# Altium footprint library Libraries_2014_0618.PcbLib: 391 footprints (part 19 of 25)
Each footprint in its own frame and in the unit in brackets; x right, y up, seen from the top. Pads: shape width x height; smd on the part's side, far side on the other; paste and mask are expansions set on the pad; w line width, h text height; cw(c..) or ccw(c..) is an arc to the next point about the centre after c.
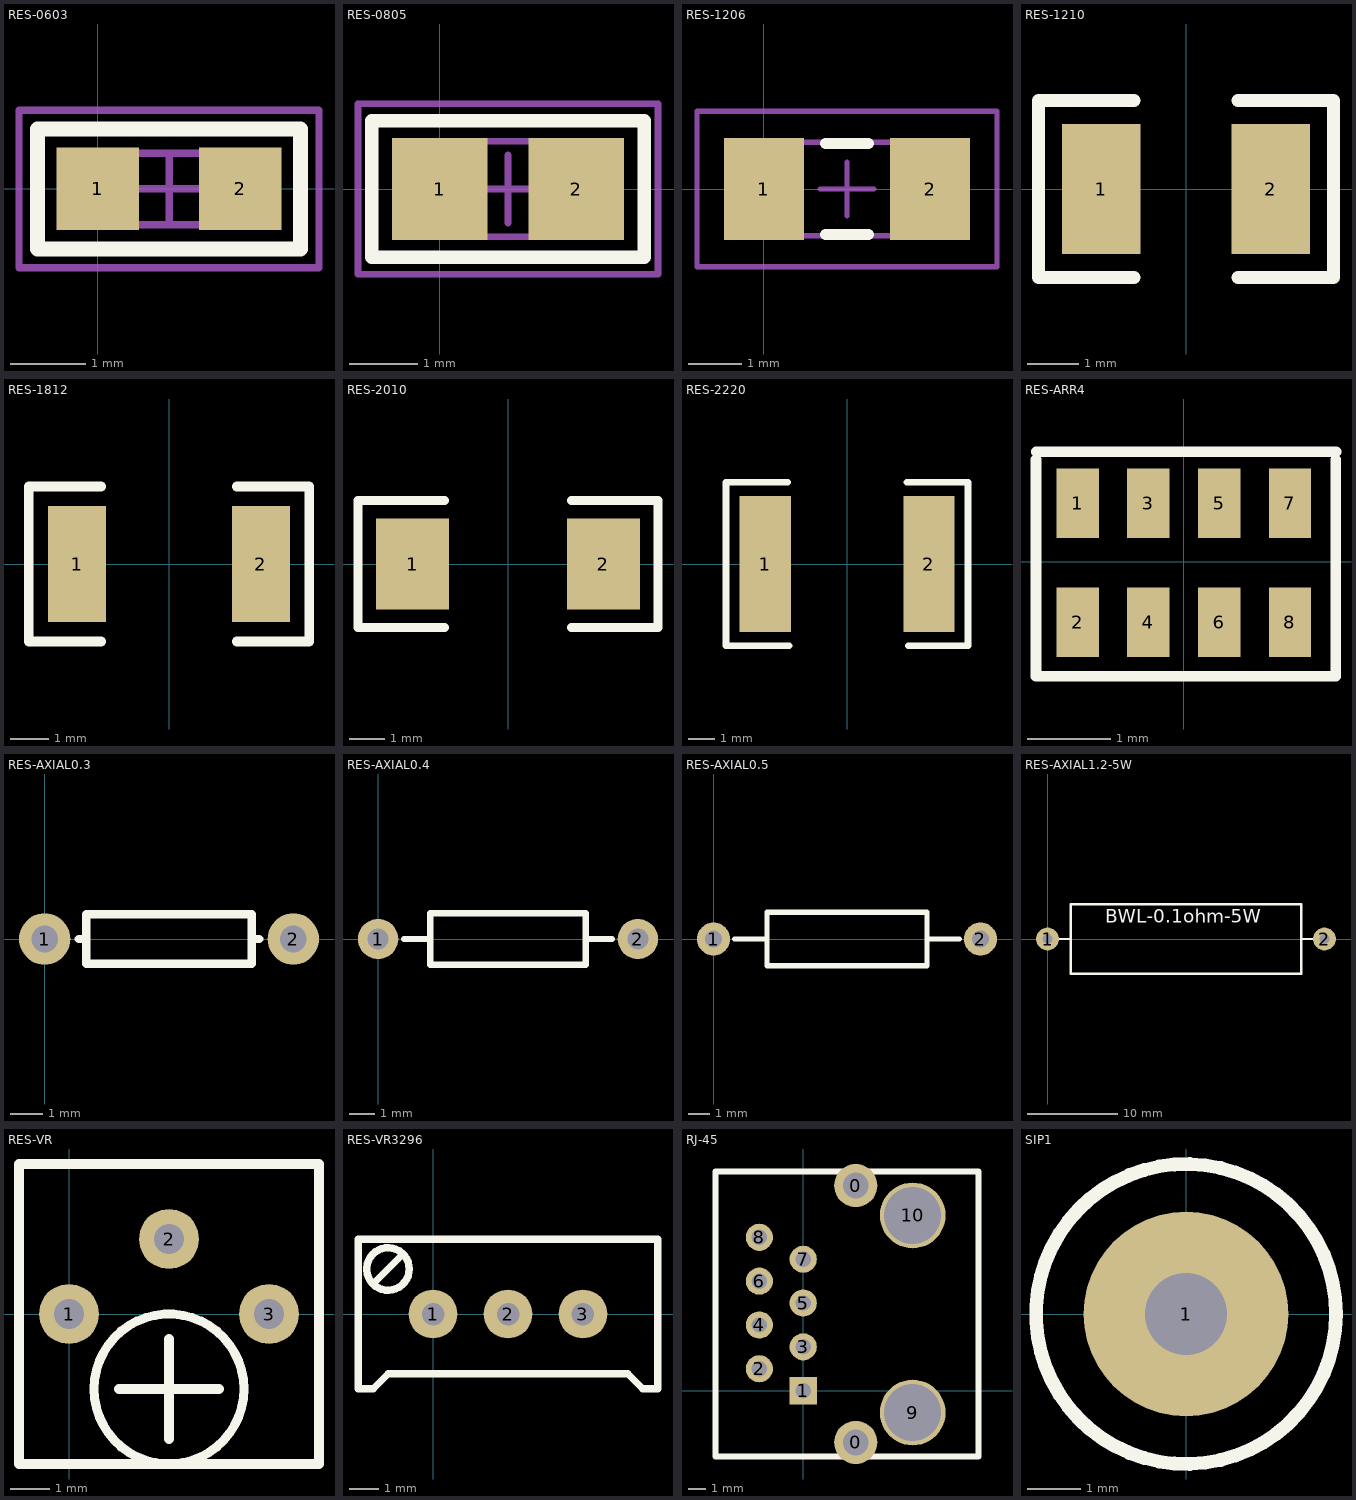
[diagram p18: the footprints below, top view; thin cyan lines are the x and y axes]

## RES-0603 [mm]
pads (2):
  rect 1.1x1.1 smd: 1(0,0) 2(1.9,0)
Top Overlay:
  lines w0.2: -0.8,-0.8 -0.8,0.8 2.7,0.8 2.7,-0.8 -0.8,-0.8
Mechanical 13:
  lines w0.1: 0.1,-0.475 0.1,0.475 1.8,0.475 1.8,-0.475 0.1,-0.475
Mechanical 15:
  lines w0.1: 0.475,0 1.425,0 ; 0.95,-0.475 0.95,0.475 ; -1.05,-1.05 -1.05,1.05 2.95,1.05 2.95,-1.05 -1.05,-1.05
3D body: height 0.6, standoff 0, extent 0.1,-0.475 1.8,0.475

## RES-0805 [mm]
pads (2):
  rect 1.4x1.5 smd: 1(0,0) 2(2,0)
Top Overlay:
  lines w0.2: -1,-1 3,-1 3,1 -1,1 -1,-1
Mechanical 13:
  lines w0.1: -0.075,-0.7 2.075,-0.7 2.075,0.7 -0.075,0.7 -0.075,-0.7
Mechanical 15:
  lines w0.1: 0.5,0 1.5,0 ; 1,-0.5 1,0.5 ; -1.2,-1.25 3.2,-1.25 3.2,1.25 -1.2,1.25 -1.2,-1.25
3D body: height 0.65, standoff 0, extent -0.075,-0.7 2.075,0.7

## RES-1206 [mm]
pads (2):
  rect 1.5x1.9 smd: 1(0,0) 2(3.1,0)
Top Overlay:
  lines w0.2: 1.15,-0.85 1.95,-0.85 ; 1.15,0.85 1.95,0.85
Mechanical 13:
  lines w0.1: -0.125,-0.875 -0.125,0.875 3.225,0.875 3.225,-0.875 -0.125,-0.875
Mechanical 15:
  lines w0.1: 1.05,0 2.05,0 ; 1.55,-0.5 1.55,0.5 ; -1.25,-1.45 -1.25,1.45 4.35,1.45 4.35,-1.45 -1.25,-1.45
3D body: height 0.71, standoff 0, extent -0.125,-0.875 3.225,0.875

## RES-1210 [mil]
pads (2):
  rect 60x100 smd: 1(-65,0) 2(65,0)
Top Overlay:
  lines w10: -40,-68 -113,-68 -113,68 -40,68 ; 40,-68 113,-68 113,68 40,68

## RES-1812 [mil]
pads (2):
  rect 60x120 smd: 1(-95,0) 2(95,0)
Top Overlay:
  lines w10: -70,-80 -145,-80 -145,80 -70,80 ; 70,-80 145,-80 145,80 70,80

## RES-2010 [mil]
pads (2):
  rect 80x100 smd: 1(-105,0) 2(105,0)
Top Overlay:
  lines w10: -70,-70 -165,-70 -165,70 -70,70 ; 70,-70 165,-70 165,70 70,70

## RES-2220 [mil]
pads (2):
  rect 75x200 smd: 1(-120,0) 2(120,0)
Top Overlay:
  lines w10: -87.5,120 -177.5,120 -177.5,-120 -85,-120 ; 87.5,120 177.5,120 177.5,-120 90,-120

## RES-ARR4 [mm]
pads (8):
  rect 0.508x0.835 smd: 1(-1.275,0.701) 2(-1.275,-0.727) 3(-0.425,0.701) 4(-0.425,-0.727) 5(0.425,0.701) 6(0.425,-0.727) 7(1.275,0.701) 8(1.275,-0.727)
Top Overlay:
  lines w0.127: -1.775,1.225 -1.775,-1.375 1.825,-1.375 1.825,1.225 ; -1.771,1.321 1.829,1.321

## RES-AXIAL0.3 [mil]
pads (2):
  round 62 hole 32: 1(0,0) 2(300,0)
Top Overlay:
  lines w10: 41,0 50,0 ; 259,0 250,0 ; 250,0 250,30 50,30 50,-30 250,-30 250,0

## RES-AXIAL0.4 [mil]
pads (2):
  round 62 hole 32: 1(0,0) 2(400,0)
Top Overlay:
  lines w10: 40,0 80,0 ; 320,0 360,0 ; 80,-40 80,40 320,40 320,-40 80,-40

## RES-AXIAL0.5 [mil]
pads (2):
  round 62 hole 32: 1(0,0) 2(500,0)
Top Overlay:
  lines w10: 40,0 100,0 ; 400,0 460,0 ; 100,-50 400,-50 400,50 100,50 100,-50

## RES-AXIAL1.2-5W [mil]
pads (2):
  round 100 hole 45: 1(0,0) 2(1200,0)
Top Overlay:
  lines w10: 50,0 100,0 ; 1100,0 1150,0 ; 100,0 100,150 1100,150 1100,-150 100,-150 100,0
  text "BWL-0.1ohm-5W" at 250,50 h100

## RES-VR [mil]
pads (3):
  round 60 hole 30: 1(0,0) 2(100,75) 3(200,0)
Top Overlay:
  circle w9: c100,-75 r75
  lines w10: 50,-75 150,-75 ; 100,-125 100,-25 ; -50,-150 250,-150 250,150 -50,150 -50,0 -50,-150

## RES-VR3296 [mil] "3296"
pads (3):
  round 65 hole 30: 1(0,0) 2(100,0) 3(200,0)
Top Overlay:
  circle w10: c-60,60 r28.28
  lines w10: -80,40 -40,80 ; -100,-100 -80,-100 -60,-80 260,-80 280,-100 300,-100 300,100 -100,100 -100,-100

## RJ-45 [mil]
pads (12):
  round 98.43 hole 59.06: 0(120,-118.11) 0(120,468.11)
  rect 62x62 hole 35: 1(0,0)
  round 62 hole 35: 2(-100,50) 3(0,100) 4(-100,150) 5(0,200) 6(-100,250) 7(0,300) 8(-100,350)
  round 150 hole 130: 9(250,-50) 10(250,400)
Top Overlay:
  lines w13: -200,-150 -200,500 400,500 400,-150 -200,-150

## SIP1 [mil]
pads (1):
  round 150 hole 60: 1(0,0)
Top Overlay:
  circle w10: c0,0 r110